# Altium footprint library CONN_RJ.PcbLib: 39 footprints (part 3 of 3)
Each footprint in its own frame and in the unit in brackets; x right, y up, seen from the top. Pads: shape width x height; smd on the part's side, far side on the other; paste and mask are expansions set on the pad; w line width, h text height; cw(c..) or ccw(c..) is an arc to the next point about the centre after c.
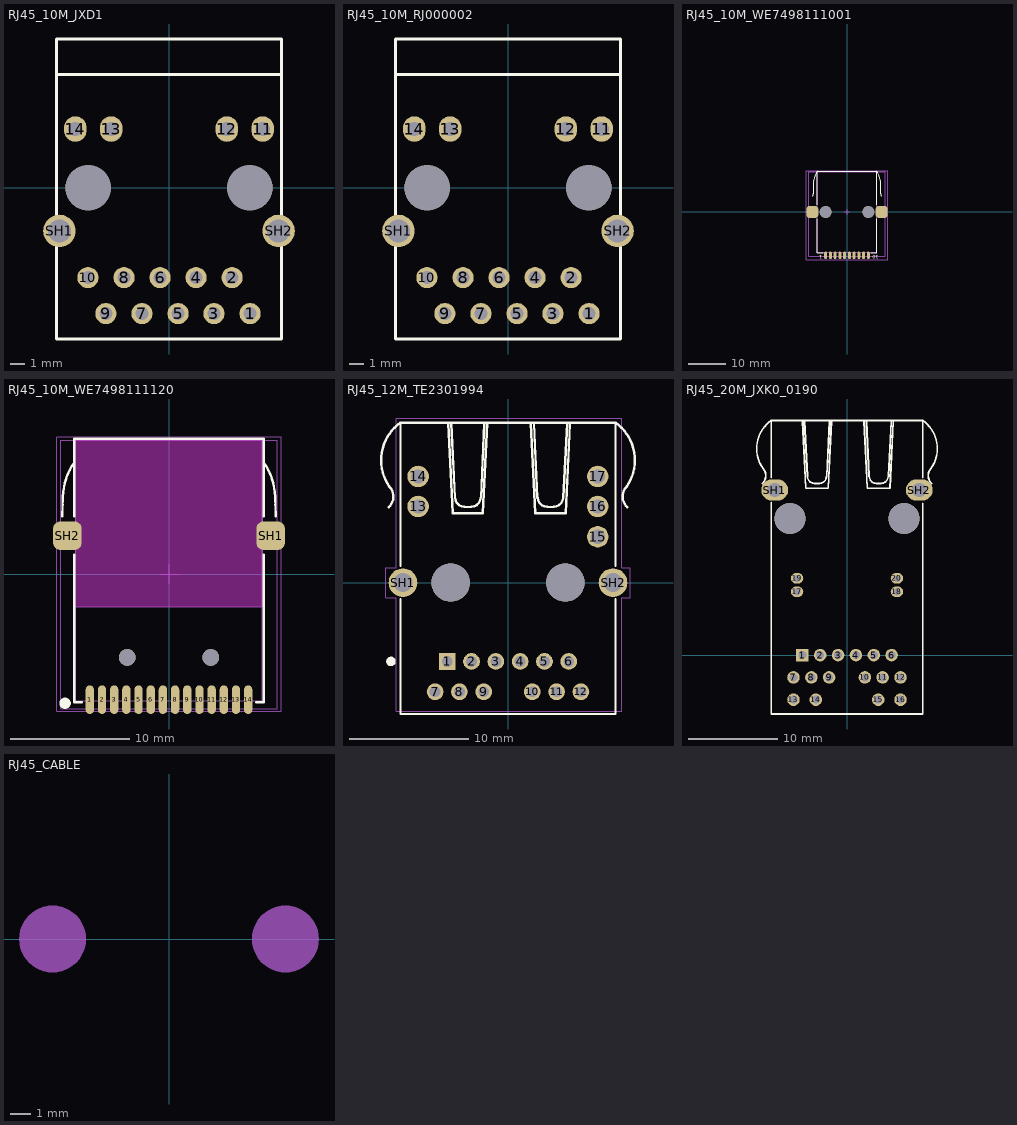
[diagram p2: the footprints below, top view; thin cyan lines are the x and y axes]

## RJ45_10M_JXD1 [mm] "RJ45, 10/100BASE, Up Tab"
height 2.25
pads (18):
  round 1.5 hole 0.9: 1(5.73,-8.89) 2(4.46,-6.35) 3(3.18,-8.89) 4(1.91,-6.35) 5(0.64,-8.89) 6(-0.635,-6.35) 7(-1.91,-8.89) 8(-3.18,-6.35) 9(-4.46,-8.89) 10(-5.73,-6.35)
  oval 1.6x1.8 hole 1: 11(6.625,4.15) 12(4.085,4.15) 13(-4.085,4.15) 14(-6.625,4.15)
  round 2.3 hole 1.6: SH1(-7.745,-3.05) SH2(7.745,-3.05)
  round 3.2 hole 3.2 unplated: ""(-5.715,0) ""(5.715,0)
Top Overlay:
  lines w0.2: -7.95,-10.668 -7.95,10.52 ; -7.94,-10.69 7.94,-10.69 ; -7.94,10.52 7.94,10.52 ; -7.915,8.02 7.95,8.02 ; 7.95,-10.668 7.95,10.52
3D body "JXD1-0008NL.step": height 15.7, standoff -3.7, extent -9.875,-10.5 9.875,11.75

## RJ45_10M_RJ000002 [mm] "RJ45, 10/100BASE, Down Tab"
height 2.25
pads (18):
  round 1.5 hole 0.9: 1(5.73,-8.89) 2(4.46,-6.35) 3(3.18,-8.89) 4(1.91,-6.35) 5(0.64,-8.89) 6(-0.635,-6.35) 7(-1.91,-8.89) 8(-3.18,-6.35) 9(-4.46,-8.89) 10(-5.73,-6.35)
  oval 1.6x1.8 hole 1: 11(6.625,4.15) 12(4.085,4.15) 13(-4.085,4.15) 14(-6.625,4.15)
  round 2.3 hole 1.6: SH1(-7.745,-3.05) SH2(7.745,-3.05)
  round 3.2 hole 3.2 unplated: ""(-5.715,0) ""(5.715,0)
Top Overlay:
  lines w0.2: -7.95,-10.668 -7.95,10.52 ; -7.94,-10.69 7.94,-10.69 ; -7.94,10.52 7.94,10.52 ; -7.915,8.02 7.95,8.02 ; 7.95,-10.668 7.95,10.52
3D body "User Library-HR911130A.STEP": height 13.5, standoff -3, extent -7.94,-10.5 7.94,10.9

## RJ45_10M_WE7498111001 [mm] "LAN Transformer, 1000Base, body 21.6x15.88mm, Up Tab"
height 13.5
pads (14):
  oval 0.8x2 smd mask+0.075: 1(-5.715,-11.64) 2(-4.445,-11.64) 3(-3.175,-11.64) 4(-1.905,-11.64) 5(-0.635,-11.64) 6(0.635,-11.64) 7(1.905,-11.64) 8(3.175,-11.64) 9(4.445,-11.64) 10(5.715,-11.64)
  rrect50% 3.2x3.2 smd: SH1(9.3,0) SH2(-9.3,0)
  round 3.2 hole 3.2 unplated: ""(-5.715,0) ""(5.715,0)
Top Overlay:
  lines w0.2: -9.209,4.203 ccw(c-10.32,4.815) -9.053,4.872 cw(c-5.438,5.312) -9.08,5.342 cw(c15.584,6.17) -9.009,8.214 cw(c-0.59,6.695) -8.04,10.9 ; -8.04,-1.84 -8.04,-10.9 -6.33,-10.9 ; -8.04,1.92 -8.04,10.9 ; 6.33,-10.9 8.04,-10.9 8.04,-1.84 ; 8.04,1.92 8.04,10.9 ; 9.209,4.203 cw(c10.32,4.815) 9.053,4.872 ccw(c5.438,5.312) 9.08,5.342 ccw(c-15.584,6.17) 9.009,8.214 ccw(c0.59,6.695) 8.04,10.9 ; -8.04,10.9 8.04,10.9
  text "1" at -6.7,-11.56 h1
  text "10" at 8.5,-11.56 h1
Mechanical 11:
  lines w0.1: -7.94,-10.8 7.94,-10.8 7.94,10.8 -7.94,10.8 -7.94,-10.8
Mechanical 13:
  lines w0.1: -10.25,-11.86 -10.25,10.74 10.25,10.74 10.25,-11.86 -10.25,-11.86
Mechanical 15:
  lines w0.1: -0.8,0 0.8,0 ; 0,-0.8 0,0.8 ; -10.995,-12.855 10.995,-12.855 10.995,11.1 -10.995,11.1 -10.995,-12.855
3D body "7498111001.stp": height 13.6, standoff -2.62, extent -10.25,-11.86 10.25,10.74

## RJ45_10M_WE7498111120 [mm] "LAN Transformer, 1000Base, body 21.84x15.65mm, Up Tab"
height 8.89
pads (18):
  oval 0.7x2.4 smd mask+0.075: 1(-6.63,-10.5) 2(-5.61,-10.5) 3(-4.59,-10.5) 4(-3.57,-10.5) 5(-2.55,-10.5) 6(-1.53,-10.5) 7(-0.51,-10.5) 8(0.51,-10.5) 9(1.53,-10.5) 10(2.55,-10.5) 11(3.57,-10.5) 12(4.59,-10.5) 13(5.61,-10.5) 14(6.63,-10.5)
  rrect50% 2.4x2.4 smd: SH1(8.51,3.24) SH2(-8.51,3.24)
  round 1.4 hole 1.4 unplated: ""(-3.5,-6.96) ""(3.5,-6.96)
Top Overlay:
  circle w0.5: c-8.7,-10.8 r0.224
  lines w0.2: -8.93,4.858 cw(c-7.19,4.955) -8.926,5.104 cw(c-7.186,5.201) -8.922,5.351 cw(c-7.183,5.447) -8.919,5.597 cw(c-7.179,5.694) -8.915,5.843 cw(c-7.175,5.94) -8.911,6.09 cw(c-1.375,5.89) -8.847,6.888 cw(c-3.725,6.44) -7.933,9.395 ; -7.925,1.64 -7.925,-10.7 -7.315,-10.7 ; -7.925,4.84 -7.925,11.34 7.925,11.34 7.925,4.84 ; 7.315,-10.7 7.925,-10.7 7.925,1.64 ; 7.933,9.395 cw(c3.725,6.44) 8.847,6.888 cw(c1.375,5.89) 8.911,6.09 cw(c7.175,5.94) 8.915,5.843 cw(c7.179,5.694) 8.919,5.597 cw(c7.183,5.447) 8.922,5.351 cw(c7.186,5.201) 8.926,5.104 cw(c7.19,4.955) 8.93,4.858
Keep-Out Layer:
  board cut-out: 7.81,11.24 7.81,-2.73 -7.81,-2.73 -7.81,11.24
Mechanical 8:
  lines w0.1: -7.81,-2.73 -7.81,11.24 7.81,11.24 7.81,-2.73 -7.81,-2.73
Mechanical 11:
  lines w0.1: -7.825,-10.6 7.825,-10.6 7.825,11.24 -7.825,11.24 -7.825,-10.6
Mechanical 13:
  lines w0.1: -9.075,-11.24 -9.075,11.24 9.075,11.24 9.075,-11.24 -9.075,-11.24
Mechanical 15:
  lines w0.1: -9.41,11.485 -9.41,-11.485 9.41,-11.485 9.41,11.485 ; -9.41,11.54 9.41,11.54 ; -0.8,0 0.8,0 ; 0,-0.8 0,0.8
3D body "7498111120AR.stp": height 10.1, standoff -3.2, extent -9.075,-11.24 9.075,11.24

## RJ45_12M_TE2301994 [mm] "RJ45, 1000Base, Up Tab, TE 6-2301994-1"
height 11.3
pads (21):
  rect 1.4x1.4 hole 0.9: 1(-5.085,-6.6)
  round 1.4 hole 0.9: 2(-3.055,-6.6) 3(-1.015,-6.6) 4(1.015,-6.6) 5(3.055,-6.6) 6(5.085,-6.6) 7(-6.105,-9.14) 8(-4.065,-9.14) 9(-2.035,-9.14) 10(2.035,-9.14) 11(4.065,-9.14) 12(6.105,-9.14)
  round 1.8 hole 1.2: 13(-7.525,6.38) 14(-7.525,8.89) 15(7.515,3.84) 16(7.515,6.38) 17(7.515,8.89)
  round 2.4 hole 1.6: SH1(-8.795,0) SH2(8.795,0)
  round 3.2 hole 3.2 unplated: ""(-4.8,0) ""(4.8,0)
Top Overlay:
  circle w0.4: c-9.8,-6.6 r0.2
  lines w0.2: -10,6.3 ccw(c-10.8,7.2) -9.9,8 cw(c-6.75,10.25) -9,13.4 ; -9,-1.4 -9,-11 9,-11 9,-1.4 ; -9,1.4 -9,13.4 ; -4.992,13.339 -4.625,5.806 -2.105,5.806 -1.738,13.339 ; -4.756,13.339 -4.441,7.119 -4.389,6.882 -4.284,6.672 -4.1,6.489 -3.89,6.384 -3.654,6.358 ; -3.654,6.331 -3.076,6.331 ; -3.076,6.358 -2.84,6.384 -2.63,6.489 -2.446,6.672 -2.341,6.882 -2.289,7.119 ; -2.263,7.119 -1.974,13.339 ; 1.911,13.339 2.278,5.806 4.824,5.806 5.191,13.339 ; 2.173,13.339 2.462,7.119 ; 2.488,7.119 2.541,6.882 2.646,6.672 2.829,6.489 3.039,6.384 3.275,6.358 ; 3.275,6.331 3.827,6.331 ; 3.827,6.358 4.063,6.384 4.273,6.489 4.457,6.672 4.561,6.882 4.614,7.119 ; 4.64,7.119 4.955,13.339 ; 9,1.4 9,13.4 ; 10,6.3 cw(c10.8,7.2) 9.9,8 ccw(c6.75,10.25) 9,13.4 ; -9,13.4 9,13.4
Mechanical 4:
  lines w0.05: -10.25,-1.25 -10.25,1.25 -9.365,1.25 -9.365,13.75 9.515,13.75 9.515,1.25 10.25,1.25 10.25,-1.25 9.515,-1.25 9.515,-10.75 -9.365,-10.75 -9.365,-1.25 -10.25,-1.25
3D body "c-6-2301994-1-a-3d.stp": height 13.27, standoff -3.32, extent -10.889,-10.9 10.889,13.23

## RJ45_20M_JXK0_0190 [mm] "RJ45, 1000Base, JXK0-0190NL Pulse, Up Tab"
height 14
pads (24):
  rect 1.4x1.4 hole 0.9: 1(-5,0)
  round 1.4 hole 0.9: 2(-3,0) 3(-1,0) 4(1,0) 5(3,0) 6(5,0) 7(-6,-2.5) 8(-4,-2.5) 9(-2,-2.5) 10(2,-2.5) 11(4,-2.5) 12(6,-2.5) 13(-6,-5) 14(-3.5,-5) 15(3.5,-5) 16(6,-5)
  oval 1.4x1.2 hole 0.8: 17(-5.6,7.1) 18(5.6,7.1) 19(-5.6,8.6) 20(5.6,8.6)
  oval 3x2.4 hole 1.6: SH1(-8.1,18.5) SH2(8.1,18.5)
  round 3.5 hole 3.5 unplated: ""(-6.4,15.3) ""(6.4,15.3)
Top Overlay:
  lines w0.2: -9.5,19.2 ccw(c-10.3,20.1) -9.4,20.9 cw(c-6.25,23.15) -8.5,26.3 ; -8.5,17.1 -8.5,-6.6 8.5,-6.6 8.5,17 ; -8.5,19.9 -8.5,26.3 ; -4.992,26.239 -4.625,18.706 -2.105,18.706 -1.738,26.239 ; -4.756,26.239 -4.441,20.019 -4.389,19.783 -4.284,19.573 -4.1,19.389 -3.89,19.284 -3.654,19.258 ; -3.654,19.231 -3.076,19.231 ; -3.076,19.258 -2.84,19.284 -2.63,19.389 -2.446,19.573 -2.341,19.783 -2.289,20.019 ; -2.263,20.019 -1.974,26.239 ; 1.911,26.239 2.278,18.706 4.824,18.706 5.191,26.239 ; 2.173,26.239 2.462,20.019 ; 2.488,20.019 2.541,19.783 2.646,19.573 2.829,19.389 3.039,19.284 3.275,19.258 ; 3.275,19.231 3.827,19.231 ; 3.827,19.258 4.063,19.284 4.273,19.389 4.457,19.573 4.561,19.783 4.614,20.019 ; 4.64,20.019 4.955,26.239 ; 8.5,19.9 8.5,26.3 ; 9.5,19.2 cw(c10.3,20.1) 9.4,20.9 ccw(c6.25,23.15) 8.5,26.3 ; -8.5,26.3 8.5,26.3
3D body "JXK0-0190NL_3D.STEP": height 15.24, standoff -3.6, extent -9.839,-6.502 9.839,26.188

## RJ45_CABLE [mm] "RJ45 Ethernet CABLE"
height 13.2
pads (2):
  round 3.3 on Mech13: ""(-5.715,0) ""(5.715,0)
3D body "RJ45cat5step.stp": height 24.61, standoff -2.07, extent -5.637,-2.095 6.043,145.273